# Altium footprint library Diodes.PcbLib: 67 footprints (part 4 of 5)
Each footprint in its own frame and in the unit in brackets; x right, y up, seen from the top. Pads: shape width x height; smd on the part's side, far side on the other; paste and mask are expansions set on the pad; w line width, h text height; cw(c..) or ccw(c..) is an arc to the next point about the centre after c.
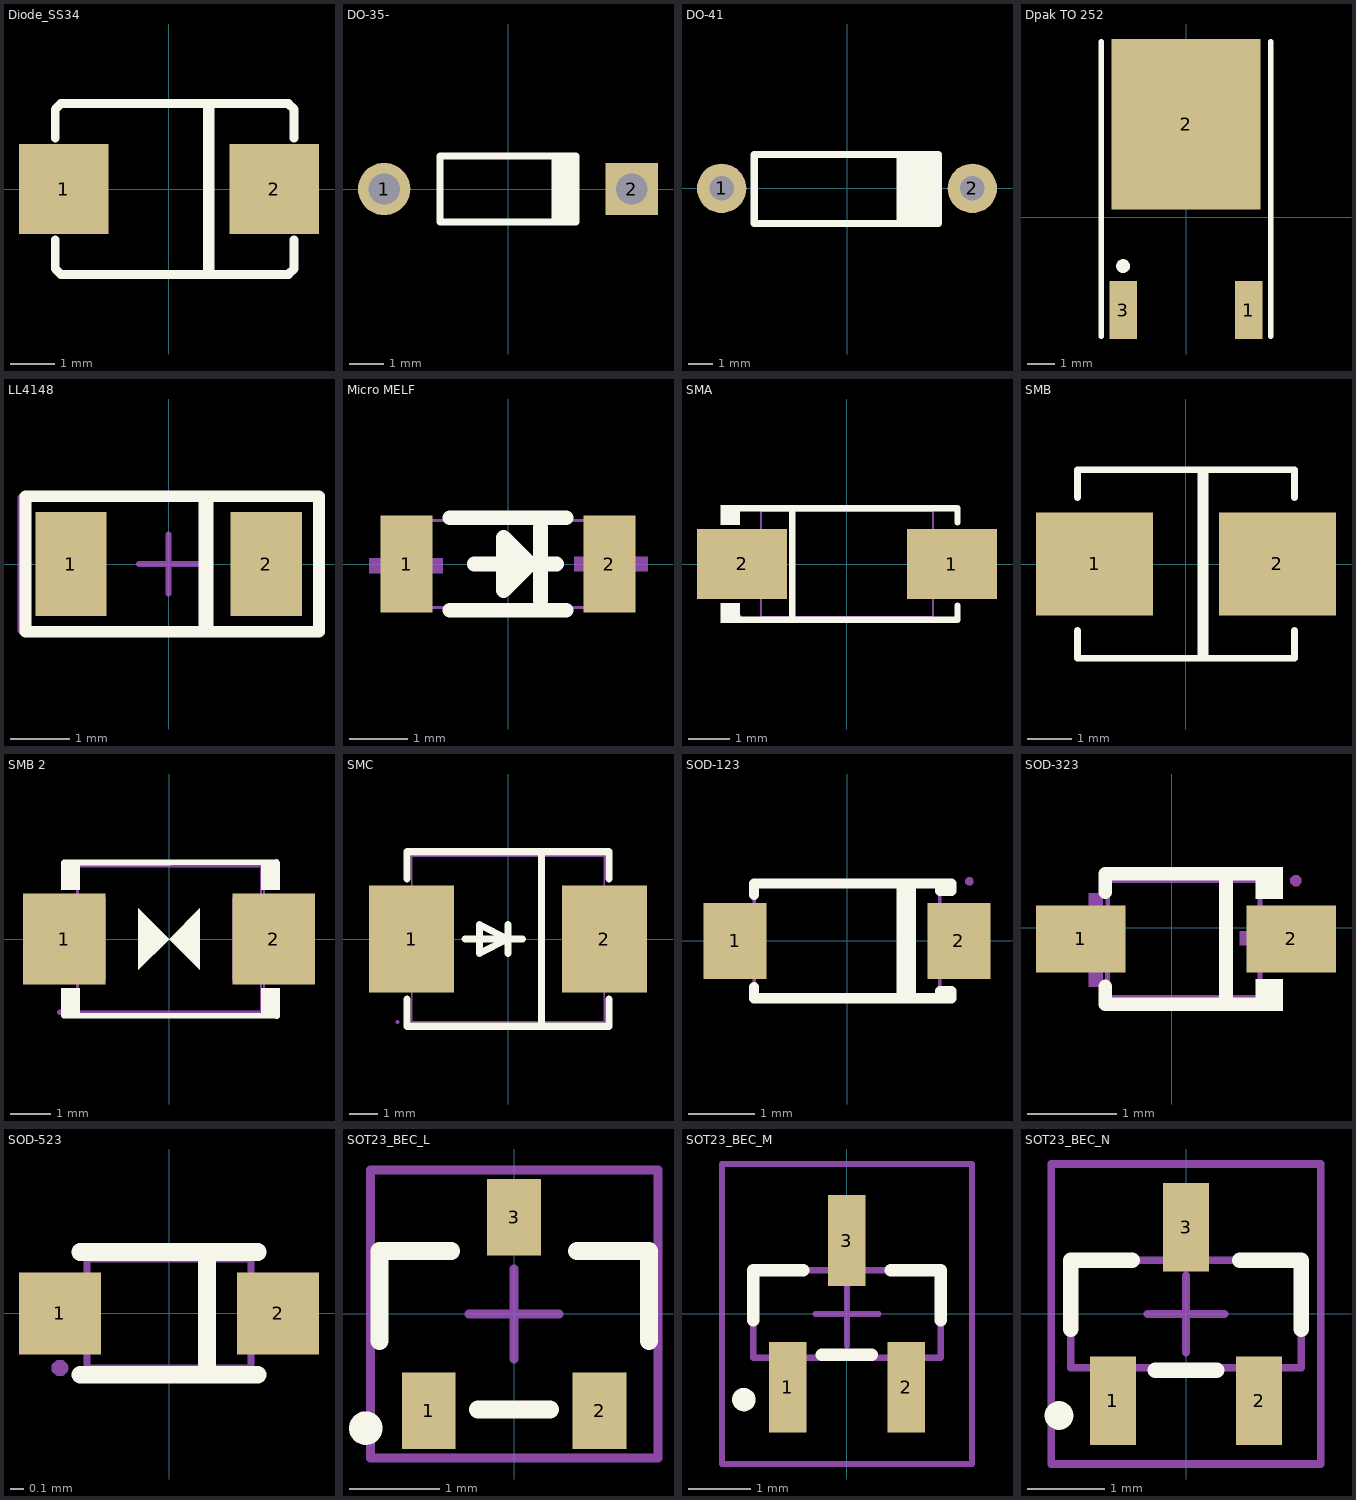
[diagram p3: the footprints below, top view; thin cyan lines are the x and y axes]

## Diode_SS34 [mm]
height 10.95
pads (2):
  rect 2x2 smd: 1(-2.35,0) 2(2.35,0)
Top Overlay:
  rectangle: 0.762,-1.905 1.016,1.905
  lines w0.2: -2.54,-1.143 -2.54,-1.778 -2.413,-1.905 2.667,-1.905 2.794,-1.778 2.794,-1.143 ; -2.54,1.143 -2.54,1.778 -2.413,1.905 2.667,1.905 2.794,1.778 2.794,1.143
3D body "SW3DPS-DIOD SMD 10BF10-DEFAULT.STEP": height 2.4, standoff -0.03, extent -2.574,-1.822 2.726,1.778

## DO-35- [mm] "Diode, Axial; Body 3.8 x 1.9 mm (LxDia. max), Lead Dia. 0.53 mm (max)"
height 1.9
pads (2):
  round 1.5 hole 0.9: 1(-3.55,0)
  rect 1.5x1.5 hole 0.9: 2(3.55,0)
Top Overlay:
  rectangle: 1.25,-0.95 2.05,0.95
  lines w0.2: 1.95,-0.95 -1.95,-0.95 -1.95,0.95 1.95,0.95
3D body "SW3dPS-do_35.STEP": height 1.89, standoff -2.29, extent -3.815,-0.87 3.815,0.87

## DO-41 [mm]
pads (2):
  round 2 hole 1: 1(-5.08,0) 2(5.08,0)
Top Overlay:
  rectangle: 2.007,-1.422 3.861,1.321
  lines w0.3: 3.708,-1.422 -3.759,-1.422 -3.759,1.372 3.708,1.372
3D body "User Library-DO-41-2.step": height 2.67, standoff -2.65, extent -5.512,-1.36 5.512,1.36

## Dpak TO 252 [mm]
pads (3):
  rect 1x2.1 smd: 1(2.285,-3.375) 3(-2.285,-3.375)
  rect 5.4x6.2 smd: 2(0,3.375)
Top Overlay:
  circle w0.25: c-2.285,-1.775 r0.125
  lines w0.2: -3.085,-4.325 -3.085,6.375 ; 3.085,-4.325 3.085,6.375
3D body "User Library-DPAK-1.step": height 2.39, standoff -0.02, extent -3.27,-4.111 3.27,5.828

## LL4148 [mm] "MELF Diode, 2-Leads, Body 3.5x1.4mm, IPC Medium Density"
height 1.6
pads (2):
  rect 1.2x1.75 smd: 1(-1.65,0) 2(1.65,0)
Top Overlay:
  rectangle: 0.508,-1.143 0.762,1.143
  lines w0.2: -2.413,-1.016 -2.413,1.143 2.54,1.143 ; -2.413,1.016 -2.413,-1.143 2.54,-1.143 ; 2.54,-1.143 2.54,1.143 ; 2.54,-1.143 2.54,1.143
Mechanical 15:
  lines w0.1: -0.5,0 0.5,0 ; 0,-0.5 0,0.5 ; -2.5,-1.125 2.5,-1.125 2.5,1.125 -2.5,1.125 -2.5,-1.125
3D body "User Library-Diode MELF.STEP": height 1.55, standoff 0.05, extent -1.775,-0.748 1.725,0.75

## Micro MELF [mm]
pads (2):
  rect 0.9x1.676 smd: 1(-1.75,0) 2(1.75,0)
Top Overlay:
  region: 0.127,-0.254 0.127,0.254 0,0.254 0,-0.254
  lines w0.254: -1,-0.8 1,-0.8 ; -1,0.8 1,0.8 ; -0.584,0 0.838,0 ; 0.559,-0.635 0.559,0.635 ; -0.076,-0.457 0.381,0 -0.076,0.457 -0.076,-0.457
Mechanical 6:
  region: 1.143,-0.127 1.143,0.127 2.413,0.127 2.413,-0.127 1.778,-0.127
  region: -1.651,-0.635 -1.905,-0.635 -1.905,0.635 -1.651,0.635 -1.651,0
  region: -2.397,-0.156 -2.397,0.098 -1.127,0.098 -1.127,-0.156 -1.762,-0.156
Mechanical 15:
  region: -1.35,-0.75 -1.75,-0.75 -1.75,0.75 -1.35,0.75
  region: 1.75,-0.75 1.35,-0.75 1.35,0.75 1.75,0.75
  region: -1.6,-0.7 -1.6,-0.659 -1.659,-0.601 -1.741,-0.601 -1.8,-0.659 -1.8,-0.7 -1.8,-0.741 -1.741,-0.799 -1.659,-0.799 -1.6,-0.741 -1.6,-0.7
  lines w0.051: -1.75,-0.75 1.75,-0.75 1.75,0.75 -1.75,0.75 -1.75,-0.75

## SMA [mm] "L4.2-W2.6-LS5.3-RD     JLCPCB"
pads (2):
  rect 2.2x1.7 smd: 1(2.565,0) 2(-2.565,0)
Top Overlay:
  region: -2.625,-1.44 -2.625,-0.962 -3.082,-0.962 -3.082,-1.44
  region: -2.625,1.44 -2.625,0.962 -3.082,0.962 -3.082,1.44
  lines w0.152: -2.701,-1.364 2.701,-1.364 2.701,-1.013 ; -2.701,1.364 2.701,1.364 2.701,1.013 ; -1.339,-1.364 -1.339,1.364
Mechanical 6:
  region: 2.142,-0.644 2.142,0.644 1.949,0.644 1.949,-0.644
  region: 2.432,-0.097 2.432,0.097 1.659,0.097 1.659,-0.097
  region: -2.432,-0.097 -2.432,0.097 -1.659,0.097 -1.659,-0.097
Mechanical 15:
  region: -2.568,-1.3 -2.568,-1.275 -2.603,-1.24 -2.653,-1.24 -2.688,-1.275 -2.688,-1.3 -2.688,-1.325 -2.653,-1.36 -2.603,-1.36 -2.568,-1.325
  region: -2.628,-0.725 -2.628,0.725 -1.488,0.725 -1.488,-0.725
  region: 2.628,0.725 2.628,-0.725 1.488,-0.725 1.488,0.725
  lines w0.051: -2.1,-1.3 2.1,-1.3 2.1,1.3 -2.1,1.3 -2.1,-1.3
3D body "User Library-DIOM5528X26.step": height 2.6, standoff 0.03, extent -2.877,-1.4 2.623,1.4

## SMB [mil]
pads (2):
  rect 103x91 smd: 1(-80.5,0) 2(80.5,0)
Top Overlay:
  rectangle: 10,-85 20,85
  lines w6: -95.5,-58.6 -95.5,-83 95.5,-83 95.5,-58.6 ; -95.5,58.6 -95.5,83 95.5,83 95.5,58.6
3D body "User Library-SMBJ33CAHE3.STEP": height 96.1, standoff -0.2, extent -110.03,-77.11 110.04,78

## SMB 2 [mm] "L4.6-W3.6-LS5.3-BI                 JLCPCB"
pads (2):
  rect 2.047x2.241 smd: 1(-2.591,0) 2(2.591,0)
Top Overlay:
  region: -0.762,-0.762 -0.762,0.762 0,0
  region: 0.762,-0.762 0,0 0.762,0.762
  region: -2.667,-1.905 -2.667,-1.215 -2.21,-1.215 -2.21,-1.905
  region: -2.667,1.905 -2.667,1.215 -2.21,1.215 -2.21,1.905
  region: 2.286,1.905 2.286,1.215 2.743,1.215 2.743,1.905
  region: 2.286,-1.905 2.286,-1.215 2.743,-1.215 2.743,-1.905
  lines w0.152: -2.599,-1.89 2.667,-1.905 ; -2.591,1.887 2.663,1.905
Mechanical 15:
  region: -2.7,1.025 -2.7,-1.025 -1.568,-1.025 -1.568,1.025
  region: 2.7,1.025 2.7,-1.025 1.568,-1.025 1.568,1.025
  region: -2.64,-1.81 -2.64,-1.785 -2.675,-1.75 -2.725,-1.75 -2.76,-1.785 -2.76,-1.81 -2.76,-1.835 -2.725,-1.87 -2.675,-1.87 -2.64,-1.835
  lines w0.051: -2.275,-1.8 -2.275,1.8 2.275,1.8 2.275,-1.8 -2.275,-1.8 ; -2.249,-1.81 -2.249,1.81 2.351,1.81 2.351,-1.81 -2.249,-1.81
3D body "User Library-SMBJ33CAHE3.STEP": height 2.44, standoff -0.01, extent -2.795,-1.905 2.795,2.035

## SMC [mm] "L7.1-W6.2-LS8.1-RD     JLCPCB"
pads (2):
  rect 3.03x3.82 smd: 1(-3.435,0) 2(3.435,0)
Top Overlay:
  lines w0.254: -3.6,-2.141 -3.6,-3.11 3.6,-3.11 3.6,-2.141 ; -3.6,2.141 -3.6,3.11 3.6,3.11 3.6,2.141 ; -1.524,0 0.508,0 ; 0,-0.508 0,0.508 0,0 ; 1.192,-3.11 1.192,3.11 ; 0,0 -1.016,0.508 -1.016,-0.508 0,0
Mechanical 6:
  region: 4.33,-0.254 2.552,-0.254 2.552,0.254 4.33,0.254
  region: -3.181,0.895 -3.181,-0.883 -3.689,-0.883 -3.689,0.895
  region: -2.54,-0.254 -4.318,-0.254 -4.318,0.254 -2.54,0.254
Mechanical 15:
  region: -2.928,-1.475 -3.943,-1.475 -3.943,1.475 -2.928,1.475
  region: 2.928,1.475 3.943,1.475 3.943,-1.475 2.928,-1.475
  region: -4.003,-2.952 -4.003,-2.977 -3.968,-3.012 -3.918,-3.012 -3.883,-2.977 -3.883,-2.952 -3.883,-2.927 -3.918,-2.892 -3.968,-2.892 -4.003,-2.927
  lines w0.051: -3.427,-2.952 3.428,-2.952 3.427,2.953 -3.427,2.953 -3.427,-2.952
3D body "User Library-DIOM8261X24.step": height 2.4, standoff 0.03, extent -4.065,-3.05 4.065,3.05

## SOD-123 [mm] "L2.8-W1.8-LS3.7-RD        JLCPCB"
pads (2):
  rect 0.95x1.15 smd: 1(-1.692,0) 2(1.692,0)
Top Overlay:
  lines w0.152: -1.406,-0.698 -1.406,-0.866 1.406,-0.866 ; -1.406,0.698 -1.406,0.866 1.406,0.866 ; 0.827,-0.866 0.827,0.866 ; 0.97,-0.866 0.97,0.866 ; 1.406,-0.866 1.406,-0.755 1.58,-0.755 1.58,-0.866 1.406,-0.866 ; 1.406,0.866 1.406,0.755 1.58,0.755 1.58,0.866 1.406,0.866
Mechanical 6:
  region: -1.746,-0.346 -1.746,0.416 -1.556,0.416 -1.556,-0.346
  region: -2.03,-0.063 -2.03,0.127 -1.272,0.127 -1.272,-0.063
  region: 2.088,-0.097 2.088,0.093 1.33,0.093 1.33,-0.097
Mechanical 15:
  region: -1.851,0.465 -1.851,-0.465 -1.301,-0.465 -1.301,0.465
  region: 1.851,0.465 1.851,-0.465 1.301,-0.465 1.301,0.465
  region: 1.79,0.9 1.79,0.875 1.826,0.84 1.875,0.84 1.91,0.875 1.91,0.9 1.91,0.925 1.875,0.96 1.826,0.96 1.79,0.925
  lines w0.051: -1.4,-0.9 -1.4,0.9 1.4,0.9 1.4,-0.9 -1.4,-0.9

## SOD-323 [mm] "L1.8-W1.3-LS2.5-RD        JLCPCB"
pads (2):
  rect 1x0.75 smd: 1(-1.016,-0.127) 2(1.329,-0.127)
Top Overlay:
  region: 0.932,0.675 0.932,0.323 1.236,0.323 1.236,0.675
  region: 0.932,-0.929 0.932,-0.577 1.236,-0.577 1.236,-0.929
  lines w0.152: -0.745,-0.657 -0.745,-0.853 1.008,-0.853 ; -0.745,0.393 -0.745,0.599 1.008,0.599 ; 0.603,-0.853 0.603,0.599
Mechanical 6:
  region: -0.926,-0.657 -0.926,0.383 -0.77,0.383 -0.77,-0.657
  region: -1.158,-0.217 -1.158,-0.061 -0.534,-0.061 -0.534,-0.217
  region: 1.382,-0.197 1.382,-0.041 0.758,-0.041 0.758,-0.197
Mechanical 15:
  region: 0.972,-0.287 0.972,0.033 1.092,0.033 1.092,-0.287
  region: 1.082,-0.287 1.082,0.033 1.382,0.033 1.382,-0.287
  region: -0.828,-0.287 -0.828,0.033 -0.708,0.033 -0.708,-0.287
  region: -1.118,-0.287 -1.118,0.033 -0.818,0.033 -0.818,-0.287
  region: 1.322,0.523 1.322,0.498 1.357,0.463 1.406,0.463 1.442,0.498 1.442,0.523 1.442,0.548 1.406,0.583 1.357,0.583 1.322,0.548
  lines w0.051: -0.718,-0.777 0.982,-0.777 0.982,0.523 -0.718,0.523 -0.718,-0.777

## SOD-523 [mm] "L1.2-W0.8-LS1.6-FD                  JLCPCB"
pads (2):
  rect 0.6x0.6 smd: 1(-0.8,0) 2(0.8,0)
Top Overlay:
  lines w0.13: -0.65,-0.45 0.65,-0.45 ; -0.65,0.45 0.65,0.45 ; 0.279,-0.444 0.279,0.406
Mechanical 6:
  region: -0.876,0.266 -0.776,0.266 -0.776,-0.284 -0.876,-0.284
  region: 0.6,0.05 0.95,0.05 0.95,-0.05 0.6,-0.05
  region: -1,0.05 -0.65,0.05 -0.65,-0.05 -1,-0.05
Mechanical 15:
  region: 0.8,-0.15 0.508,-0.15 0.508,0.15 0.8,0.15
  region: -0.8,0.15 -0.508,0.15 -0.508,-0.15 -0.8,-0.15
  region: -0.74,-0.4 -0.741,-0.376 -0.776,-0.342 -0.824,-0.342 -0.859,-0.376 -0.86,-0.4 -0.859,-0.424 -0.824,-0.458 -0.776,-0.458 -0.741,-0.424
  lines w0.051: -0.6,-0.4 -0.6,0.4 0.6,0.4 0.6,-0.4 -0.6,-0.4

## SOT23_BEC_L [mm] "SOT23, 3-Leads, Body 2.9x1.3mm, Pitch 0.95mm, Lead Span 2.4mm, IPC High Density"
height 1.14
pads (3):
  rect 0.6x0.85 smd: 1(-0.95,-1.075) 2(0.95,-1.075) 3(0,1.075)
Top Overlay:
  circle w0.2: c-1.651,-1.27 r0.086
  lines w0.2: -1.5,-0.3 -1.5,0.7 -0.7,0.7 ; -0.4,-1.064 0.4,-1.064 ; 0.7,0.7 1.5,0.7 1.5,-0.3
Mechanical 15:
  lines w0.1: -0.5,0 0.5,0 ; 0,-0.5 0,0.5 ; -1.6,-1.6 -1.6,1.6 1.6,1.6 1.6,-1.6 -1.6,-1.6
3D body "User Library-N-MOS_BSS123_SOT23.STEP": height 1, standoff 0, extent -1.45,-1.225 1.45,1.075

## SOT23_BEC_M [mm] "SOT23, 3-Leads, Body 2.9x1.3mm, Pitch 0.95mm, Lead Span 2.4mm, IPC Low Density"
height 1.14
pads (3):
  rect 0.6x1.45 smd: 1(-0.95,-1.175) 2(0.95,-1.175) 3(0,1.175)
Top Overlay:
  circle w0.2: c-1.651,-1.37 r0.086
  lines w0.2: -1.5,-0.1 -1.5,0.7 -0.7,0.7 ; -0.4,-0.656 0.4,-0.656 ; 0.7,0.7 1.5,0.7 1.5,-0.1
Mechanical 13:
  lines w0.1: -1.5,-0.7 -1.5,0.7 1.5,0.7 1.5,-0.7 -1.5,-0.7
Mechanical 15:
  lines w0.1: -0.5,0 0.5,0 ; 0,-0.5 0,0.5 ; -2,-2.4 -2,2.4 2,2.4 2,-2.4 -2,-2.4
3D body "User Library-N-MOS_BSS123_SOT23.STEP": height 1, standoff 0, extent -1.45,-1.225 1.45,1.075

## SOT23_BEC_N [mm] "SOT23, 3-Leads, Body 2.9x1.3mm, Pitch 0.95mm, Lead Span 2.4mm, IPC Medium"
height 1.14
pads (3):
  rect 0.6x1.15 smd: 1(-0.95,-1.125) 2(0.95,-1.125) 3(0,1.125)
Top Overlay:
  circle w0.2: c-1.651,-1.32 r0.086
  lines w0.2: -1.5,-0.2 -1.5,0.7 -0.7,0.7 ; -0.4,-0.733 0.4,-0.733 ; 0.7,0.7 1.5,0.7 1.5,-0.2
Mechanical 13:
  lines w0.1: -1.5,-0.7 1.5,-0.7 1.5,0.7 -1.5,0.7 -1.5,-0.7
Mechanical 15:
  lines w0.1: -0.5,0 0.5,0 ; 0,-0.5 0,0.5 ; -1.75,-1.95 1.75,-1.95 1.75,1.95 -1.75,1.95 -1.75,-1.95
3D body "User Library-N-MOS_BSS123_SOT23.STEP": height 1, standoff 0, extent -1.45,-1.225 1.45,1.075